# Altium footprint library SMT.PcbLib: 379 footprints (part 18 of 24)
Each footprint in its own frame and in the unit in brackets; x right, y up, seen from the top. Pads: shape width x height; smd on the part's side, far side on the other; paste and mask are expansions set on the pad; w line width, h text height; cw(c..) or ccw(c..) is an arc to the next point about the centre after c.
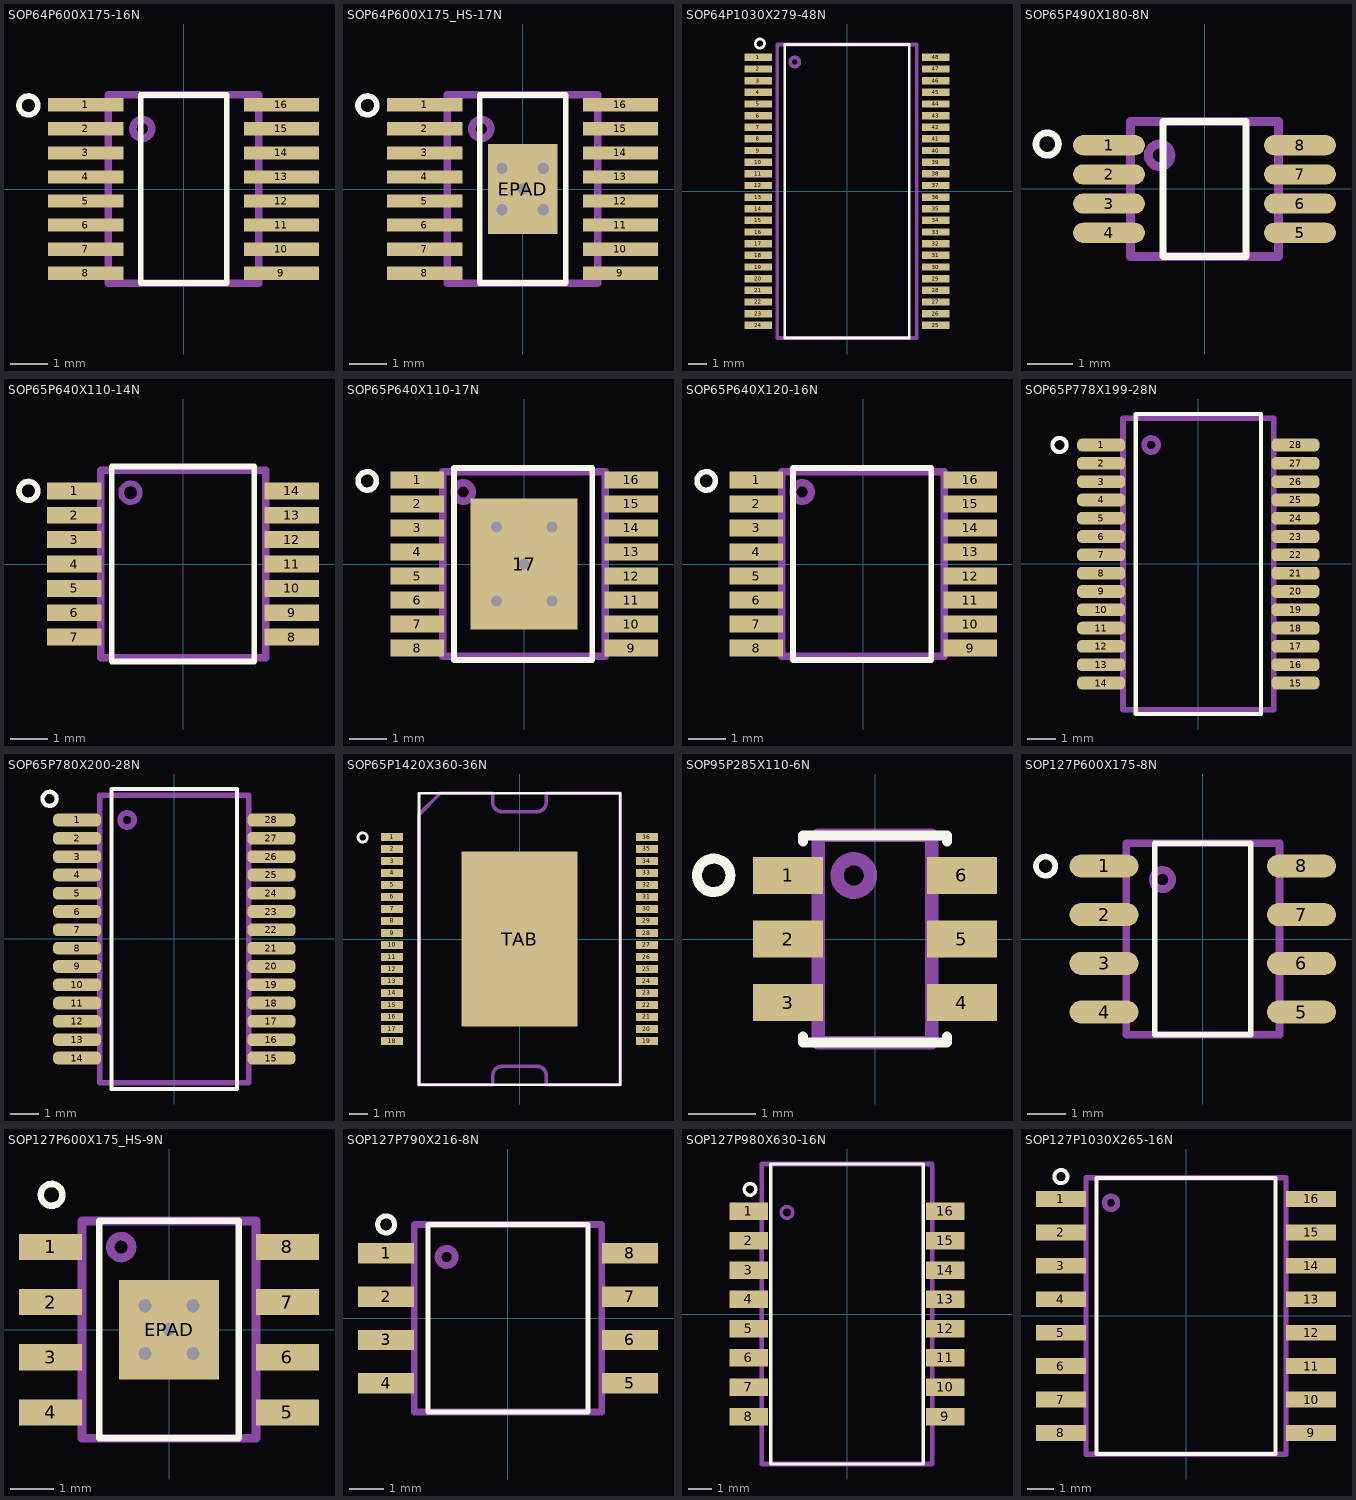
[diagram p17: the footprints below, top view; thin cyan lines are the x and y axes]

## SOP64P600X175-16N [mm] "QSOP, 16-Leads, Body 4,90x3,90mm, Pitch 0,64mm, Thermal Pad 2,40.2x1,85.2mm, IPC Medium Density"
height 1.75
pads (16):
  rect 2x0.35 smd mask+0.05: 1(-2.6,2.24) 2(-2.6,1.6) 3(-2.6,0.96) 4(-2.6,0.32) 5(-2.6,-0.32) 6(-2.6,-0.96) 7(-2.6,-1.6) 8(-2.6,-2.24) 9(2.6,-2.24) 10(2.6,-1.6) 11(2.6,-0.96) 12(2.6,-0.32) 13(2.6,0.32) 14(2.6,0.96) 15(2.6,1.6) 16(2.6,2.24)
Top Overlay:
  circle w0.15: c-4.127,2.222 r0.25
  lines w0.15: -1.143,-2.5 1.143,-2.5 1.143,2.5 -1.143,2.5 -1.143,-2.5
Mechanical 1:
  circle w0.2: c-1.1,1.6 r0.25
  lines w0.2: -2,-2.5 2,-2.5 2,2.5 -2,2.5 -2,-2.5
3D body "QSOP16.STEP": height 1.65, standoff 0, extent -2.95,-2.445 2.95,2.455

## SOP64P600X175_HS-17N [mm] "SOP, 16-Leads, Body 4,90x3,90mm, Pitch 0,64mm, Thermal Pad 2,40x1,85mm, IPC Medium Density"
height 1.75
pads (17):
  rect 2x0.35 smd mask+0.05: 1(-2.6,2.24) 2(-2.6,1.6) 3(-2.6,0.96) 4(-2.6,0.32) 5(-2.6,-0.32) 6(-2.6,-0.96) 7(-2.6,-1.6) 8(-2.6,-2.24) 9(2.6,-2.24) 10(2.6,-1.6) 11(2.6,-0.96) 12(2.6,-0.32) 13(2.6,0.32) 14(2.6,0.96) 15(2.6,1.6) 16(2.6,2.24)
  rect 1.85x2.4 hole 0.3 mask+0.05: EPAD(0,0)
via -0.55,0.55 diameter 0.7 hole 0.3
via 0.55,0.55 diameter 0.7 hole 0.3
via -0.55,-0.55 diameter 0.7 hole 0.3
via 0.55,-0.55 diameter 0.7 hole 0.3
Top Overlay:
  circle w0.15: c-4.127,2.222 r0.25
  lines w0.15: -1.143,-2.5 1.143,-2.5 1.143,2.5 -1.143,2.5 -1.143,-2.5
Top Paste:
  rectangle: -0.762,-1.016 0.762,1.016
Mechanical 1:
  circle w0.2: c-1.1,1.6 r0.25
  lines w0.2: -2,-2.5 2,-2.5 2,2.5 -2,2.5 -2,-2.5
3D body "SOP64P600X175_HS-17N.step": height 1.75, standoff 0, extent -3,-2.45 3,2.45

## SOP64P1030X279-48N [mm] "SOP, 48-Leads, Body 15,88x7,49mm, Pitch 0,64mm, IPC Medium Density"
height 2.79
pads (48):
  rect 1.5x0.4 smd mask+0.05: 1(-4.85,7.302) 2(-4.85,6.667) 3(-4.85,6.032) 4(-4.85,5.397) 5(-4.85,4.763) 6(-4.85,4.127) 7(-4.85,3.492) 8(-4.85,2.857) 9(-4.85,2.222) 10(-4.85,1.587) 11(-4.85,0.953) 12(-4.85,0.318) 13(-4.85,-0.318) 14(-4.85,-0.953) 15(-4.85,-1.587) 16(-4.85,-2.222) 17(-4.85,-2.857) 18(-4.85,-3.492) 19(-4.85,-4.127) 20(-4.85,-4.763) 21(-4.85,-5.397) 22(-4.85,-6.032) 23(-4.85,-6.667) 24(-4.85,-7.302) 25(4.85,-7.302) 26(4.85,-6.667) 27(4.85,-6.032) 28(4.85,-5.397) 29(4.85,-4.763) 30(4.85,-4.127) 31(4.85,-3.492) 32(4.85,-2.857) 33(4.85,-2.222) 34(4.85,-1.587) 35(4.85,-0.953) 36(4.85,-0.318) 37(4.85,0.318) 38(4.85,0.953) 39(4.85,1.587) 40(4.85,2.222) 41(4.85,2.857) 42(4.85,3.492) 43(4.85,4.127) 44(4.85,4.763) 45(4.85,5.397) 46(4.85,6.032) 47(4.85,6.667) 48(4.85,7.302)
Top Overlay:
  circle w0.15: c-4.75,8.053 r0.25
  lines w0.15: -3.4,-8 3.4,-8 3.4,8 -3.4,8 -3.4,-8
Mechanical 1:
  circle w0.2: c-2.85,7.05 r0.25
  lines w0.2: -3.8,-8 3.8,-8 3.8,8 -3.8,8 -3.8,-8
3D body "SOP64P1030X279-48N.step": height 2.79, standoff 0, extent -5.175,-8 5.175,8

## SOP65P490X180-8N [mm] "SOP, 8-Leads, Body 3,00x3,20mm, Pitch 0,65mm, IPC Medium Density"
height 1.8
pads (8):
  oval 1.6x0.45 smd mask+0.03: 1(-2.125,0.975) 2(-2.125,0.325) 3(-2.125,-0.325) 4(-2.125,-0.975) 5(2.125,-0.975) 6(2.125,-0.325) 7(2.125,0.325) 8(2.125,0.975)
Top Overlay:
  circle w0.15: c-3.5,1 r0.25
  lines w0.15: -0.925,-1.5 0.925,-1.5 0.925,1.5 -0.925,1.5 -0.925,-1.5
Mechanical 1:
  circle w0.2: c-1,0.75 r0.25
  lines w0.2: -1.65,-1.5 1.65,-1.5 1.65,1.5 -1.65,1.5 -1.65,-1.5
3D body "User Library-SSOP-8-P-0_65.STEP": height 1.16, standoff 0.01, extent -2,-1.5 2,1.4

## SOP65P640X110-14N [mm] "TSSOP14:14 leads; body width 4.4 mm"
height 1.1
pads (14):
  rect 1.45x0.45 smd paste+0 mask+0.03: 1(-2.9,1.95) 2(-2.9,1.3) 3(-2.9,0.65) 4(-2.9,0) 5(-2.9,-0.65) 6(-2.9,-1.3) 7(-2.9,-1.95) 8(2.9,-1.95) 9(2.9,-1.3) 10(2.9,-0.65) 11(2.9,0) 12(2.9,0.65) 13(2.9,1.3) 14(2.9,1.95)
Top Overlay:
  circle w0.15: c-4.125,1.95 r0.25
  lines w0.15: -1.9,-2.6 -1.9,2.6 1.9,2.6 1.9,-2.6 -1.9,-2.6
Mechanical 1:
  circle w0.15: c-1.4,1.9 r0.25
  lines w0.2: -2.2,-2.495 2.2,-2.495 2.2,2.505 -2.2,2.505 -2.2,-2.495
3D body "SW3dPS-TSSOP14-1.STEP": height 1.1, standoff 0, extent -3.2,-2.5 3.2,2.5

## SOP65P640X110-17N [mm] "SOP, 16-Leads, Body 5x4.4mm, Pitch 0.65mm, IPC High Density"
height 1.1
pads (17):
  rect 1.45x0.45 smd mask+0.03: 1(-2.9,2.275) 2(-2.9,1.625) 3(-2.9,0.975) 4(-2.9,0.325) 5(-2.9,-0.325) 6(-2.9,-0.975) 7(-2.9,-1.625) 8(-2.9,-2.275) 9(2.9,-2.275) 10(2.9,-1.625) 11(2.9,-0.975) 12(2.9,-0.325) 13(2.9,0.325) 14(2.9,0.975) 15(2.9,1.625) 16(2.9,2.275)
  rect 2.9x3.55 hole 0.3: 17(0,0)
via -0.75,1 diameter 0.8 hole 0.3
via 0.75,1 diameter 0.8 hole 0.3
via 0.75,-1 diameter 0.8 hole 0.3
via -0.75,-1 diameter 0.8 hole 0.3
Top Overlay:
  circle w0.15: c-4.25,2.25 r0.25
  lines w0.15: -1.9,-2.6 1.85,-2.6 1.85,2.6 -1.9,2.6 -1.9,-2.6
Top Paste:
  region: -1.3,1.7 -1.3,-1.7 1.3,-1.7 1.3,1.7
Mechanical 1:
  circle w0.2: c-1.65,1.95 r0.25
  lines w0.2: -2.2,-2.5 2.2,-2.5 2.2,2.5 -2.2,2.5 -2.2,-2.5
3D body "User Library-tssop16-2.STEP": height 1.2, standoff 0, extent -3.2,-2.55 3.2,2.55

## SOP65P640X120-16N [mm] "SOP, 16-Leads, Body 5,00x4,40mm, Pitch 0,65mm, IPC Medium Density"
height 1.2
pads (16):
  rect 1.45x0.45 smd mask+0.03: 1(-2.9,2.275) 2(-2.9,1.625) 3(-2.9,0.975) 4(-2.9,0.325) 5(-2.9,-0.325) 6(-2.9,-0.975) 7(-2.9,-1.625) 8(-2.9,-2.275) 9(2.9,-2.275) 10(2.9,-1.625) 11(2.9,-0.975) 12(2.9,-0.325) 13(2.9,0.325) 14(2.9,0.975) 15(2.9,1.625) 16(2.9,2.275)
Top Overlay:
  circle w0.15: c-4.25,2.25 r0.25
  lines w0.15: -1.9,-2.6 1.85,-2.6 1.85,2.6 -1.9,2.6 -1.9,-2.6
Mechanical 1:
  circle w0.2: c-1.65,1.95 r0.25
  lines w0.2: -2.2,-2.5 2.2,-2.5 2.2,2.5 -2.2,2.5 -2.2,-2.5
3D body "User Library-tssop16-2.STEP": height 1.2, standoff 0, extent -3.2,-2.55 3.2,2.55

## SOP65P778X199-28N [mm] "SSOP, 28-Leads, Body 10.2x7.78mm, Pitch 0.65mm, IPC Low Density"
height 1.99
pads (28):
  rrect70% 1.7x0.45 smd mask+0.03: 1(-3.449,4.225) 2(-3.449,3.575) 3(-3.449,2.925) 4(-3.449,2.275) 5(-3.449,1.625) 6(-3.449,0.975) 7(-3.449,0.325) 8(-3.449,-0.325) 9(-3.449,-0.975) 10(-3.449,-1.625) 11(-3.449,-2.275) 12(-3.449,-2.925) 13(-3.449,-3.575) 14(-3.449,-4.225) 15(3.451,-4.225) 16(3.451,-3.575) 17(3.451,-2.925) 18(3.451,-2.275) 19(3.451,-1.625) 20(3.451,-0.975) 21(3.451,-0.325) 22(3.451,0.325) 23(3.451,0.975) 24(3.451,1.625) 25(3.451,2.275) 26(3.451,2.925) 27(3.451,3.575) 28(3.451,4.225)
Top Overlay:
  circle w0.15: c-4.925,4.225 r0.25
  lines w0.15: -2.225,-5.325 2.225,-5.325 2.225,5.325 -2.225,5.325 -2.225,-5.325
Mechanical 1:
  circle w0.2: c-1.675,4.225 r0.25
  lines w0.2: -3.945,-4.225 -2.675,-4.225 ; -3.945,-3.575 -2.675,-3.575 ; -3.945,-2.925 -2.675,-2.925 ; -3.945,-2.275 -2.675,-2.275 ; -3.945,-1.625 -2.675,-1.625 ; -3.945,-0.975 -2.675,-0.975 ; -3.945,-0.325 -2.675,-0.325 ; -3.945,0.325 -2.675,0.325 ; -3.945,0.975 -2.675,0.975 ; -3.945,1.625 -2.675,1.625 ; -3.945,2.275 -2.675,2.275 ; -3.945,2.925 -2.675,2.925 ; -3.945,3.575 -2.675,3.575 ; -3.945,4.225 -2.675,4.225 ; 2.675,-4.225 3.945,-4.225 ; 2.675,-3.575 3.945,-3.575 ; 2.675,-2.925 3.945,-2.925 ; 2.675,-2.275 3.945,-2.275 ; 2.675,-1.625 3.945,-1.625 ; 2.675,-0.975 3.945,-0.975 ; 2.675,-0.325 3.945,-0.325 ; 2.675,0.325 3.945,0.325 ; 2.675,0.975 3.945,0.975 ; 2.675,1.625 3.945,1.625 ; 2.675,2.275 3.945,2.275 ; 2.675,2.925 3.945,2.925 ; 2.675,3.575 3.945,3.575 ; 2.675,4.225 3.945,4.225 ; -2.675,-5.175 -2.675,5.175 2.675,5.175 2.675,-5.175 -2.675,-5.175
3D body "SOP65P778X199-28N.STEP": height 2.15, standoff 0, extent -3.875,-5.168 3.881,5.162

## SOP65P780X200-28N [mm] "SSOP, 28-Leads, Body 10.2x7.8mm, Pitch 0.65mm, IPC Low Density"
height 2
pads (28):
  rrect70% 1.7x0.45 smd mask+0.03: 1(-3.449,4.225) 2(-3.449,3.575) 3(-3.449,2.925) 4(-3.449,2.275) 5(-3.449,1.625) 6(-3.449,0.975) 7(-3.449,0.325) 8(-3.449,-0.325) 9(-3.449,-0.975) 10(-3.449,-1.625) 11(-3.449,-2.275) 12(-3.449,-2.925) 13(-3.449,-3.575) 14(-3.449,-4.225) 15(3.451,-4.225) 16(3.451,-3.575) 17(3.451,-2.925) 18(3.451,-2.275) 19(3.451,-1.625) 20(3.451,-0.975) 21(3.451,-0.325) 22(3.451,0.325) 23(3.451,0.975) 24(3.451,1.625) 25(3.451,2.275) 26(3.451,2.925) 27(3.451,3.575) 28(3.451,4.225)
Top Overlay:
  circle w0.15: c-4.425,4.975 r0.25
  lines w0.15: -2.225,-5.325 2.225,-5.325 2.225,5.325 -2.225,5.325 -2.225,-5.325
Mechanical 1:
  circle w0.2: c-1.675,4.225 r0.25
  lines w0.2: -3.9,-4.225 -2.65,-4.225 ; -3.9,-3.575 -2.65,-3.575 ; -3.9,-2.925 -2.65,-2.925 ; -3.9,-2.275 -2.65,-2.275 ; -3.9,-1.625 -2.65,-1.625 ; -3.9,-0.975 -2.65,-0.975 ; -3.9,-0.325 -2.65,-0.325 ; -3.9,0.325 -2.65,0.325 ; -3.9,0.975 -2.65,0.975 ; -3.9,1.625 -2.65,1.625 ; -3.9,2.275 -2.65,2.275 ; -3.9,2.925 -2.65,2.925 ; -3.9,3.575 -2.65,3.575 ; -3.9,4.225 -2.65,4.225 ; 2.65,-4.225 3.9,-4.225 ; 2.65,-3.575 3.9,-3.575 ; 2.65,-2.925 3.9,-2.925 ; 2.65,-2.275 3.9,-2.275 ; 2.65,-1.625 3.9,-1.625 ; 2.65,-0.975 3.9,-0.975 ; 2.65,-0.325 3.9,-0.325 ; 2.65,0.325 3.9,0.325 ; 2.65,0.975 3.9,0.975 ; 2.65,1.625 3.9,1.625 ; 2.65,2.275 3.9,2.275 ; 2.65,2.925 3.9,2.925 ; 2.65,3.575 3.9,3.575 ; 2.65,4.225 3.9,4.225 ; -2.65,-5.1 -2.65,5.1 2.65,5.1 2.65,-5.1 -2.65,-5.1
3D body "SOP65P778X199-28N.STEP": height 2.15, standoff 0, extent -3.878,-5.165 3.878,5.165

## SOP65P1420X360-36N [mm] "SOP, 36-Leads, Body 15,90x11,00mm, Pitch 0,65mm, IPC Medium Density"
height 3.6
pads (37):
  rect 1.2x0.42 smd mask+0.03: 1(-6.9,5.525) 2(-6.9,4.875) 3(-6.9,4.225) 4(-6.9,3.575) 5(-6.9,2.925) 6(-6.9,2.275) 7(-6.9,1.625) 8(-6.9,0.975) 9(-6.9,0.325) 10(-6.9,-0.325) 11(-6.9,-0.975) 12(-6.9,-1.625) 13(-6.9,-2.275) 14(-6.9,-2.925) 15(-6.9,-3.575) 16(-6.9,-4.225) 17(-6.9,-4.875) 18(-6.9,-5.525) 19(6.9,-5.525) 20(6.9,-4.875) 21(6.9,-4.225) 22(6.9,-3.575) 23(6.9,-2.925) 24(6.9,-2.275) 25(6.9,-1.625) 26(6.9,-0.975) 27(6.9,-0.325) 28(6.9,0.325) 29(6.9,0.975) 30(6.9,1.625) 31(6.9,2.275) 32(6.9,2.925) 33(6.9,3.575) 34(6.9,4.225) 35(6.9,4.875) 36(6.9,5.525)
  rect 6.3x9.5 hole 0.3: TAB(0,0)
Top Overlay:
  circle w0.15: c-8.5,5.5 r0.25
  lines w0.15: -4.35,7.9 -4.3,7.9 ; -5.45,-7.9 -5.45,7.9 5.45,7.9 5.45,-7.9 -5.45,-7.9
Top Paste:
  rectangle: -1.5,-2 1.5,2
Mechanical 1:
  lines w0.2: 0.9,-6.9 -0.95,-6.9 ccw(c-0.95,-7.4) -1.45,-7.4 -1.45,-7.9 -5.45,-7.9 -5.45,6.75 ; 0.9,6.9 -0.95,6.9 cw(c-0.95,7.4) -1.45,7.4 -1.45,7.9 -4.3,7.9 ; 0.95,-6.9 cw(c0.95,-7.4) 1.45,-7.4 ; 0.95,6.9 ccw(c0.95,7.4) 1.45,7.4 ; 1.45,-7.45 1.45,-7.9 5.45,-7.9 5.45,7.9 1.45,7.9 1.45,7.45 ; -5.45,6.75 -4.3,7.9 ; -5.45,6.75 -4.3,7.9
3D body "User Library-SO36.STEP": height 3.6, standoff 0.1, extent -7.2,-8.125 7,7.825

## SOP95P285X110-6N [mm] "TSOP, 6-Leads, Body 3,05x1,65mm, Pitch 0,95mm, IPC Medium Density"
height 1.1
pads (6):
  rect 1.05x0.55 smd: 1(-1.3,0.95) 2(-1.3,0) 3(-1.3,-0.95) 4(1.3,-0.95) 5(1.3,0) 6(1.3,0.95)
Top Overlay:
  circle w0.15: c-2.413,0.953 r0.25
  lines w0.15: -1.079,-1.46 -1.079,-1.55 1.079,-1.55 1.079,-1.46 ; -1.079,1.46 -1.079,1.55 1.079,1.55 1.079,1.46
Mechanical 1:
  circle w0.2: c-0.318,0.95 r0.25
  lines w0.2: -0.85,-1.55 -0.85,1.55 0.85,1.55 0.85,-1.55 -0.85,-1.55
3D body "TSOP-6.STEP": height 0.99, standoff -0.01, extent -1.35,-1.5 1.35,1.5

## SOP127P600X175-8N [mm] "SOP, 8-Leads, Body 4,90x3,90mm, Pitch 1,27mm, IPC Medium Density"
height 1.75
pads (8):
  oval 1.8x0.6 smd: 1(-2.575,1.905) 2(-2.575,0.635) 3(-2.575,-0.635) 4(-2.575,-1.905) 5(2.575,-1.905) 6(2.575,-0.635) 7(2.575,0.635) 8(2.575,1.905)
Top Overlay:
  circle w0.15: c-4.1,1.9 r0.25
  lines w0.15: -1.25,-2.5 -1.25,2.5 1.25,2.5 1.25,-2.5 -1.25,-2.5
Mechanical 1:
  circle w0.2: c-1.05,1.55 r0.25
  lines w0.2: -2,-2.5 -2,2.5 2,2.5 2,-2.5 -2,-2.5
3D body "User Library-SOIC-8-1.STEP": height 1.75, standoff 0, extent -3,-2.45 3,2.45

## SOP127P600X175_HS-9N [mm] "SOP, 8-Leads, Body 4,90x3,90mm, Pitch 1,27mm, Thermal Pad 2,29x2,29mm, IPC Medium Density"
height 1.75
pads (9):
  rect 1.45x0.6 smd: 1(-2.725,1.905) 2(-2.725,0.635) 3(-2.725,-0.635) 4(-2.725,-1.905) 5(2.725,-1.905) 6(2.725,-0.635) 7(2.725,0.635) 8(2.725,1.905)
  rect 2.29x2.29 hole 0.3: EPAD(0,0)
via 0.55,-0.55 diameter 0.7 hole 0.3
via -0.55,-0.55 diameter 0.7 hole 0.3
via 0.55,0.55 diameter 0.7 hole 0.3
via -0.55,0.55 diameter 0.7 hole 0.3
Top Overlay:
  circle w0.15: c-2.7,3.1 r0.25
  lines w0.15: -1.6,-2.5 1.6,-2.5 1.6,2.5 -1.6,2.5 -1.6,-2.5
Mechanical 1:
  circle w0.2: c-1.1,1.9 r0.25
  lines w0.2: -2,-2.5 2,-2.5 2,2.5 -2,2.5 -2,-2.5
3D body "SOP127P600X175_HS-9N.step": height 1.75, standoff 0, extent -3,-2.5 3,2.5

## SOP127P790X216-8N [mm] "SOP, 8-Leads, Body 5,29x5,29mm, Pitch 1,27mm, IPC Medium Density"
height 2.16
pads (8):
  rect 1.65x0.6 smd: 1(-3.575,1.905) 2(-3.575,0.635) 3(-3.575,-0.635) 4(-3.575,-1.905) 5(3.575,-1.905) 6(3.575,-0.635) 7(3.575,0.635) 8(3.575,1.905)
Top Overlay:
  circle w0.15: c-3.575,2.755 r0.25
  lines w0.15: -2.35,-2.75 2.35,-2.75 2.35,2.75 -2.35,2.75 -2.35,-2.75
Mechanical 1:
  circle w0.2: c-1.8,1.8 r0.25
  lines w0.2: -2.75,-2.75 2.75,-2.75 2.75,2.75 -2.75,2.75 -2.75,-2.75
3D body "SOP127P790X216-8N.step": height 2.16, standoff 0, extent -3.95,-2.75 3.95,2.75

## SOP127P980X630-16N [mm] "SOP, 16-Leads, Body 13,00x7,40mm, Pitch 1,27mm, IPC Medium Density"
height 6.3
pads (16):
  rect 1.67x0.76 smd mask+0.05: 1(-4.265,4.445) 2(-4.265,3.175) 3(-4.265,1.905) 4(-4.265,0.635) 5(-4.265,-0.635) 6(-4.265,-1.905) 7(-4.265,-3.175) 8(-4.265,-4.445) 9(4.265,-4.445) 10(4.265,-3.175) 11(4.265,-1.905) 12(4.265,-0.635) 13(4.265,0.635) 14(4.265,1.905) 15(4.265,3.175) 16(4.265,4.445)
Top Overlay:
  circle w0.15: c-4.2,5.4 r0.25
  lines w0.15: -3.3,-6.5 -3.3,6.5 3.3,6.5 3.3,-6.5 -3.3,-6.5
Mechanical 1:
  circle w0.15: c-2.6,4.4 r0.25
  lines w0.2: -3.7,-6.5 -3.7,6.5 3.7,6.5 3.7,-6.5 -3.7,-6.5
3D body "SOP127P980X630-16N.step": height 6.3, standoff 0, extent -4.875,-6.5 4.875,6.5

## SOP127P1030X265-16N [mm] "SOP, 16-Leads, Body 10,30x7,50mm, Pitch 1,27mm, IPC Medium Density"
height 2.65
pads (16):
  rect 1.9x0.6 smd: 1(-4.75,4.445) 2(-4.75,3.175) 3(-4.75,1.905) 4(-4.75,0.635) 5(-4.75,-0.635) 6(-4.75,-1.905) 7(-4.75,-3.175) 8(-4.75,-4.445) 9(4.75,-4.445) 10(4.75,-3.175) 11(4.75,-1.905) 12(4.75,-0.635) 13(4.75,0.635) 14(4.75,1.905) 15(4.75,3.175) 16(4.75,4.445)
Top Overlay:
  circle w0.15: c-4.75,5.295 r0.25
  lines w0.15: -3.4,-5.25 -3.4,5.25 3.4,5.25 3.4,-5.25 -3.4,-5.25
Mechanical 1:
  circle w0.2: c-2.85,4.3 r0.25
  lines w0.2: -3.8,-5.25 -3.8,5.25 3.8,5.25 3.8,-5.25 -3.8,-5.25
3D body "SOP127P1030X265-16N.step": height 2.65, standoff 0, extent -5.162,-5.25 5.162,5.25